# Altium footprint library Pcblib.PcbLib: 281 footprints (part 7 of 18)
Each footprint in its own frame and in the unit in brackets; x right, y up, seen from the top. Pads: shape width x height; smd on the part's side, far side on the other; paste and mask are expansions set on the pad; w line width, h text height; cw(c..) or ccw(c..) is an arc to the next point about the centre after c.
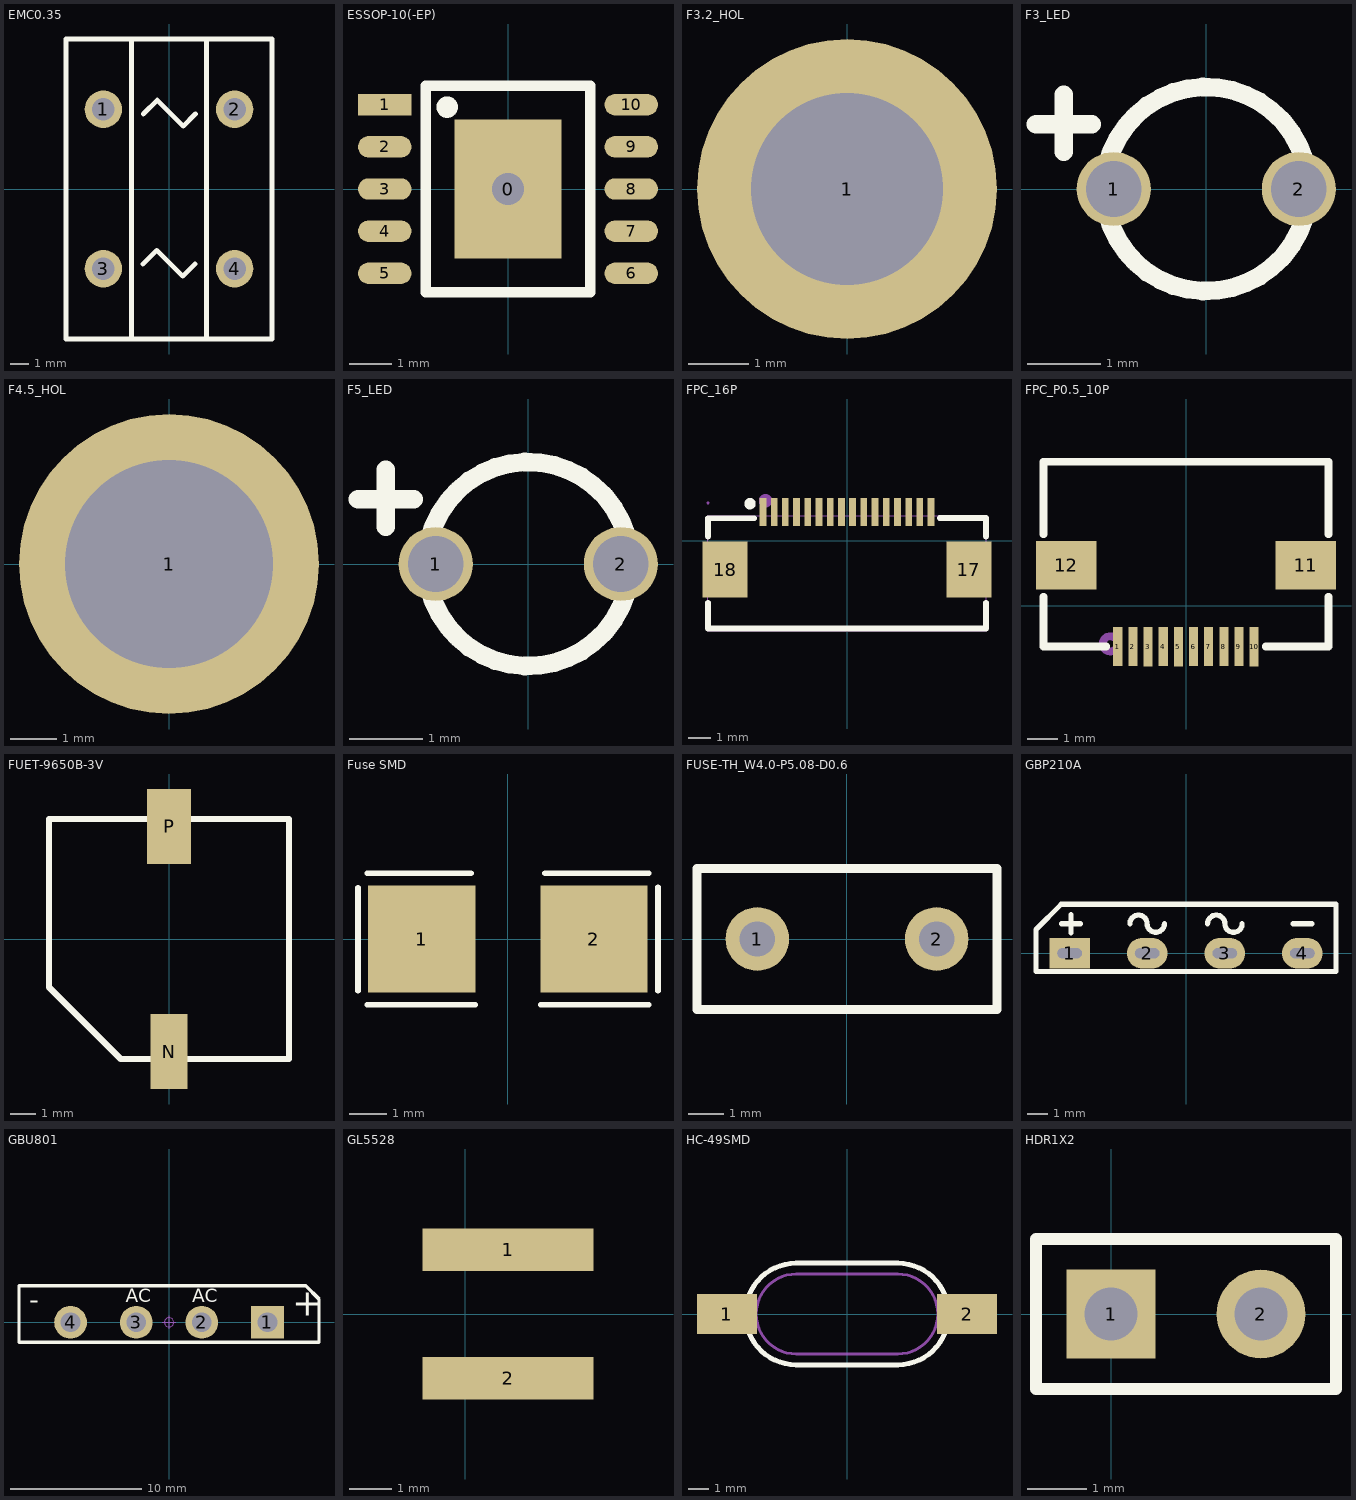
[diagram p6: the footprints below, top view; thin cyan lines are the x and y axes]

## EMC0.35 [mm]
pads (4):
  round 2 hole 1.2: 1(-3.5,4.25) 2(3.5,4.25) 3(-3.5,-4.25) 4(3.5,-4.25)
Top Overlay:
  lines w0.254: -2,-8 -2,8 ; -1.395,-4.005 -0.655,-3.265 0.735,-4.655 ; -1.37,4 -0.63,4.74 0.76,3.35 ; 1.385,-4.005 0.735,-4.655 ; 1.41,4 0.76,3.35 ; 2,-8 2,8 ; 0.735,-4.655 0.735,-4.655 ; 0.76,3.35 0.76,3.35 ; -5.5,-8 5.5,-8 5.5,8 -5.5,8 -5.5,-8
3D body: height 0.4, standoff 0, extent -5.334,-8.001 5.461,8.001

## ESSOP-10(-EP) [mil]
pads (11):
  rect 100x130 smd: 0(0,0)
  rect 50x20 smd: 1(-115.11,78.74)
  oval 50x20 smd: 2(-115.11,39.37) 3(-115.11,0) 4(-115.11,-39.37) 5(-115.11,-78.74) 6(115.11,-78.74) 7(115.11,-39.37) 8(115.11,0) 9(115.11,39.37) 10(115.11,78.74)
via 0,0 diameter 40 hole 30
Top Overlay:
  circle w10: c-56.77,76.46 r5
  lines w10: -76.77,-96.46 76.77,-96.46 76.77,96.46 -76.77,96.46 -76.77,-96.46

## F3.2_HOL [mm]
pads (1):
  round 5 hole 3.2: 1(0,0)

## F3_LED [mil]
pads (2):
  round 40 hole 30: 1(-50,0) 2(50,0)
Top Overlay:
  circle w10: c0,0 r55.12
  lines w10: -92,35 -62,35 ; -77,20 -77,51

## F4.5_HOL [mm]
pads (1):
  round 6.5 hole 4.5: 1(0,0)

## F5_LED [mil]
pads (2):
  round 40 hole 30: 1(-50,0) 2(50,0)
Top Overlay:
  circle w10: c0,0 r55.12
  lines w10: -92,35 -62,35 ; -77,20 -77,51

## FPC_16P [mm]
pads (18):
  rect 0.3x1.25 smd mask+0.05: 1(-3.75,1.288) 2(-3.25,1.288) 3(-2.75,1.288) 4(-2.25,1.288) 5(-1.75,1.288) 6(-1.25,1.288) 7(-0.75,1.288) 8(-0.25,1.288) 9(0.25,1.288) 10(0.75,1.288) 11(1.25,1.288) 12(1.75,1.288) 13(2.25,1.288) 14(2.75,1.288) 15(3.25,1.288) 16(3.75,1.288)
  rect 2x2.5 smd mask+0.05: 17(5.44,-1.288) 18(-5.44,-1.288)
Top Overlay:
  circle w0.254: c-4.327,1.651 r0.127
  lines w0.254: -6.2,-2.769 -6.2,-3.912 6.2,-3.912 6.2,-2.769 ; -6.2,0.194 -6.2,1 -4.131,1 ; 4.131,1.016 6.2,1.016 6.2,0.194
Mechanical 6:
  circle w0.3: c-3.636,1.784 r0.15
Mechanical 15:
  region: 4.6,-0.388 6.2,-0.388 6.2,-2.188 4.6,-2.188
  region: -6.2,-0.388 -4.6,-0.388 -4.6,-2.188 -6.2,-2.188
  region: -3.825,1.688 -3.675,1.688 -3.675,0.888 -3.825,0.888
  region: -3.325,1.688 -3.175,1.688 -3.175,0.888 -3.325,0.888
  region: -2.825,1.688 -2.675,1.688 -2.675,0.888 -2.825,0.888
  region: -2.325,1.688 -2.175,1.688 -2.175,0.888 -2.325,0.888
  region: -1.825,1.688 -1.675,1.688 -1.675,0.888 -1.825,0.888
  region: -1.325,1.688 -1.175,1.688 -1.175,0.888 -1.325,0.888
  region: -0.825,1.688 -0.675,1.688 -0.675,0.888 -0.825,0.888
  region: -0.325,1.688 -0.175,1.688 -0.175,0.888 -0.325,0.888
  region: 0.175,1.688 0.325,1.688 0.325,0.888 0.175,0.888
  region: 0.675,1.688 0.825,1.688 0.825,0.888 0.675,0.888
  region: 1.175,1.688 1.325,1.688 1.325,0.888 1.175,0.888
  region: 1.675,1.688 1.825,1.688 1.825,0.888 1.675,0.888
  region: 2.175,1.688 2.325,1.688 2.325,0.888 2.175,0.888
  region: 2.675,1.688 2.825,1.688 2.825,0.888 2.675,0.888
  region: 3.175,1.688 3.325,1.688 3.325,0.888 3.175,0.888
  region: 3.675,1.688 3.825,1.688 3.825,0.888 3.675,0.888
  region: -6.14,1.688 -6.14,1.712 -6.175,1.748 -6.225,1.748 -6.26,1.712 -6.26,1.688 -6.26,1.663 -6.225,1.628 -6.175,1.628 -6.14,1.663
  lines w0.051: -6.2,-4.008 6.2,-4.008 6.2,1.112 -6.2,1.112 -6.2,-4.008

## FPC_P0.5_10P [mm]
pads (12):
  rect 0.3x1.3 smd: 1(-2.252,-1.338) 2(-1.752,-1.338) 3(-1.25,-1.34) 4(-0.752,-1.338) 5(-0.25,-1.34) 6(0.248,-1.338) 7(0.748,-1.338) 8(1.248,-1.338) 9(1.748,-1.338) 10(2.25,-1.34)
  rect 2x1.6 smd: 11(3.95,1.34) 12(-3.95,1.34)
Top Overlay:
  lines w0.254: -4.7,0.309 -4.7,-1.34 -2.633,-1.34 ; -4.7,2.371 -4.7,4.76 4.7,4.76 4.7,2.371 ; 2.631,-1.34 4.7,-1.34 4.7,0.309
Mechanical 15:
  circle w0.254: c-2.5,-1.25 r0.25

## FUET-9650B-3V [mm]
height 5
pads (2):
  rect 1.5x3 smd paste-1: N(0,-4.5)
  rect 1.75x3 smd paste-1: P(0,4.5)
Top Overlay:
  lines w0.254: -4.8,-1.93 -1.93,-4.8 4.8,-4.8 4.8,4.8 -4.8,4.8 -4.8,-1.93

## Fuse SMD [mm]
pads (2):
  rect 2.91x2.911 smd: 1(-2.337,0) 2(2.33,0)
Top Overlay:
  lines w0.152: -4.064,-1.401 -4.064,1.393 ; -3.81,-1.778 -0.889,-1.778 ; -3.81,1.778 -1.002,1.778 ; 0.889,-1.778 3.81,-1.778 ; 1.002,1.778 3.81,1.778 ; 4.064,-1.397 4.064,1.397
Top Paste:
  region: -0.875,-1.355 -0.875,-0.595 -0.975,-0.495 -1.764,-0.495 -1.864,-0.395 -1.864,0.395 -1.764,0.495 -0.975,0.495 -0.875,0.595 -0.875,1.355 -0.975,1.455 -3.685,1.455 -3.785,1.355 -3.785,-1.355 -3.685,-1.455 -0.975,-1.455
  region: 0.875,-1.355 0.875,-0.595 0.975,-0.495 1.764,-0.495 1.864,-0.395 1.864,0.395 1.764,0.495 0.975,0.495 0.875,0.595 0.875,1.355 0.975,1.455 3.685,1.455 3.785,1.355 3.785,-1.355 3.685,-1.455 0.975,-1.455

## FUSE-TH_W4.0-P5.08-D0.6 [mm]
pads (2):
  round 1.8 hole 1: 1(-2.54,0) 2(2.54,0)
Top Overlay:
  lines w0.254: -4.25,-2 -4.25,2 4.25,2 4.25,-2 -4.25,-2

## GBP210A [mm]
pads (4):
  rect 2x1.5 hole 0.5 slot 1.2 at 0 deg: 1(-5.7,0)
  oval 2x1.5 hole 0.5 slot 1.2 at 0 deg: 2(-1.9,0) 3(1.9,0) 4(5.7,0)
Top Overlay:
  lines w0.254: -6.098,1.448 -5.182,1.448 ; -5.639,0.989 -5.639,1.905 ; -2.75,1.448 cw(c-2.328,1.448) -1.905,1.448 ccw(c-1.482,1.448) -1.06,1.448 ; 1.06,1.448 cw(c1.482,1.448) 1.905,1.448 ccw(c2.328,1.448) 2.75,1.448 ; 5.258,1.448 6.174,1.448 ; -7.35,-0.9 -7.35,1.159 -6.109,2.4 7.35,2.4 7.35,-0.9 -7.35,-0.9

## GBU801 [mm] "整流桥，脚距：5mm/200mil"
pads (4):
  rect 2.5x2.5 hole 1.5: 1(7.5,0)
  round 2.5 hole 1.5: 2(2.5,0) 3(-2.5,0) 4(-7.5,0)
Top Overlay:
  lines w0.254: -11.43,-1.524 11.43,-1.524 11.43,1.778 10.414,2.794 -8.422,2.794 -11.43,2.794 -11.43,-1.524
  text "AC" at 1.778,1.524 h1.02
  text "AC" at -3.302,1.524 h1.02
  text "+" at 9.398,0.508 h2.03
  text "-" at -10.668,1.016 h1.52
Mechanical 15:
  circle w0.05: c0,0 r0.35
  lines w0.05: -0.5,0 0.5,0 ; 0,-0.5 0,0.5
3D body "GBU.STEP": height 20.8, standoff -4, extent -11,-1.15 11,2.35

## GL5528 [mm] "光敏电阻"
pads (2):
  rect 4x1 smd paste-1: 1(1,1.5) 2(1,-1.5)

## HC-49SMD [mm]
height 3.5
pads (2):
  rect 3x2 smd: 1(-6,0) 2(6,0)
Top Overlay:
  lines w0.254: -2.54,-2.54 cw(c-2.54,0) -2.54,2.54 2.54,2.54 cw(c2.54,0) 2.54,-2.54 -2.54,-2.54
Mechanical 5:
  lines w0.15: -2.54,-2 cw(c-2.54,0) -2.54,2 2.54,2 cw(c2.54,0) 2.54,-2 -2.54,-2

## HDR1X2 [mm] "Connector; Header; 2 Position"
pads (2):
  rect 1.5x1.5 hole 0.9: 1(0,0)
  round 1.5 hole 0.9: 2(2.54,0)
Top Overlay:
  lines w0.2: -1.27,-1.27 3.81,-1.27 3.81,1.27 -1.27,1.27 -1.27,-1.27